# Altium footprint library Lib.PcbLib: 177 footprints (part 12 of 12)
Each footprint in its own frame and in the unit in brackets; x right, y up, seen from the top. Pads: shape width x height; smd on the part's side, far side on the other; paste and mask are expansions set on the pad; w line width, h text height; cw(c..) or ccw(c..) is an arc to the next point about the centre after c.
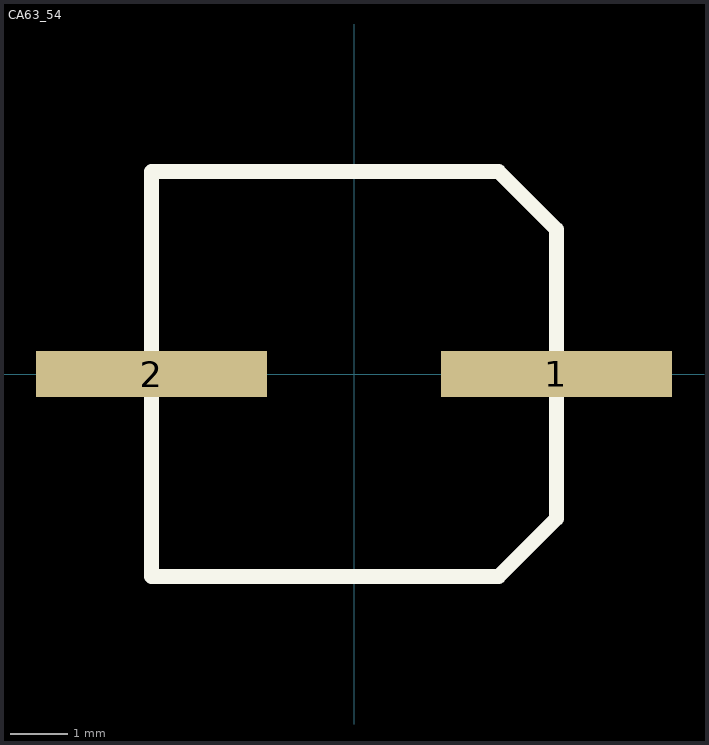
[diagram p11: the footprint, top view; thin cyan lines are the x and y axes]

## СА63_54 [mm]
height 7
pads (2):
  rect 4x0.8 smd: 1(3.5,0) 2(-3.5,0)
Top Overlay:
  lines w0.254: -3.5,-3.5 -3.5,3.5 2.5,3.5 3.5,2.5 3.5,-2.5 2.5,-3.5 -3.5,-3.5